# Altium integrated library Lattice CPLD ispLSI.IntLib: 471 symbols (part 14 of 26) (continued)
## ispLSI3160-70LQ (continued)
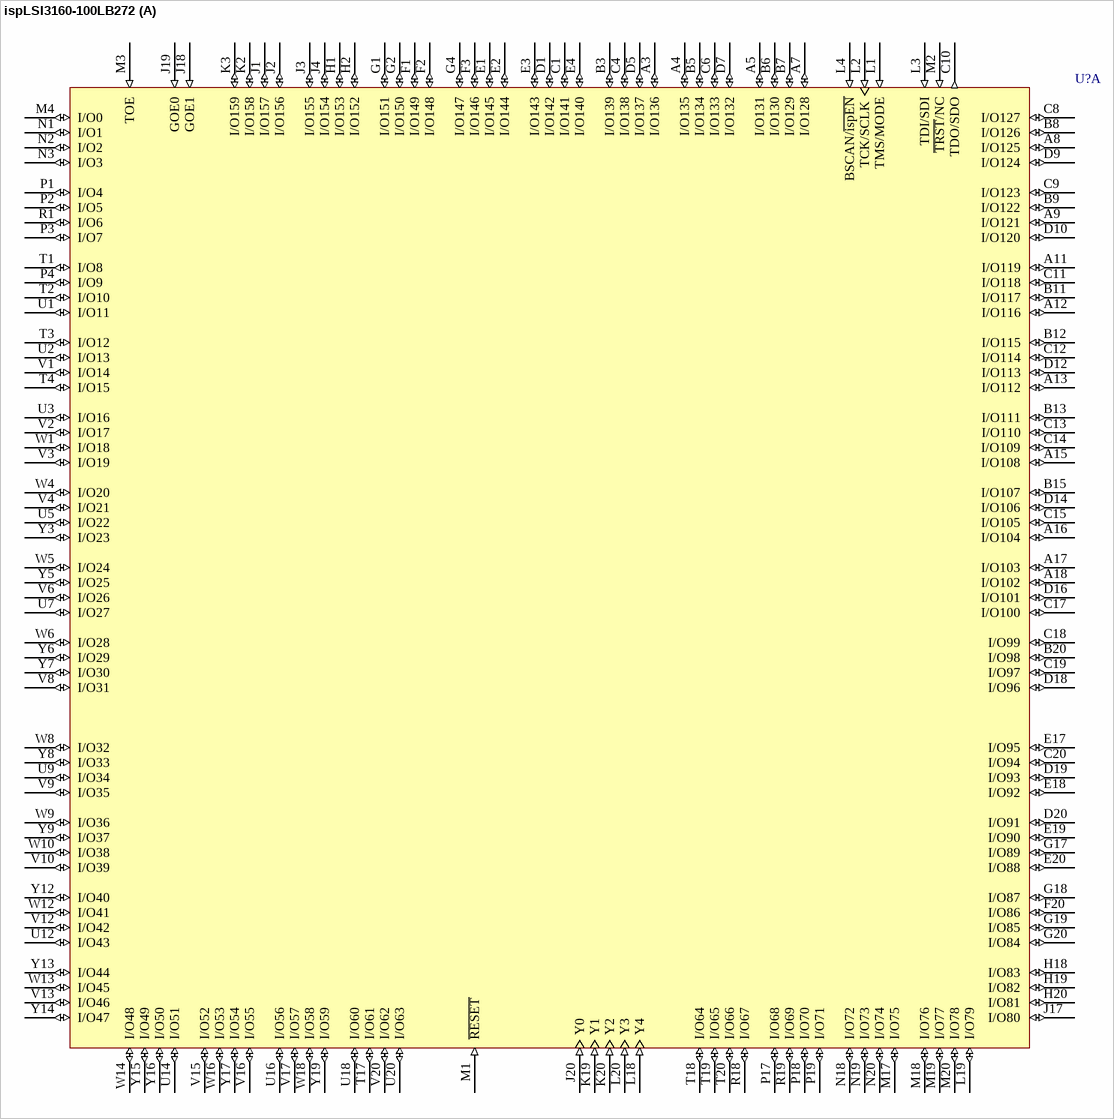
[diagram p117: symbol ispLSI3160-100LB272]

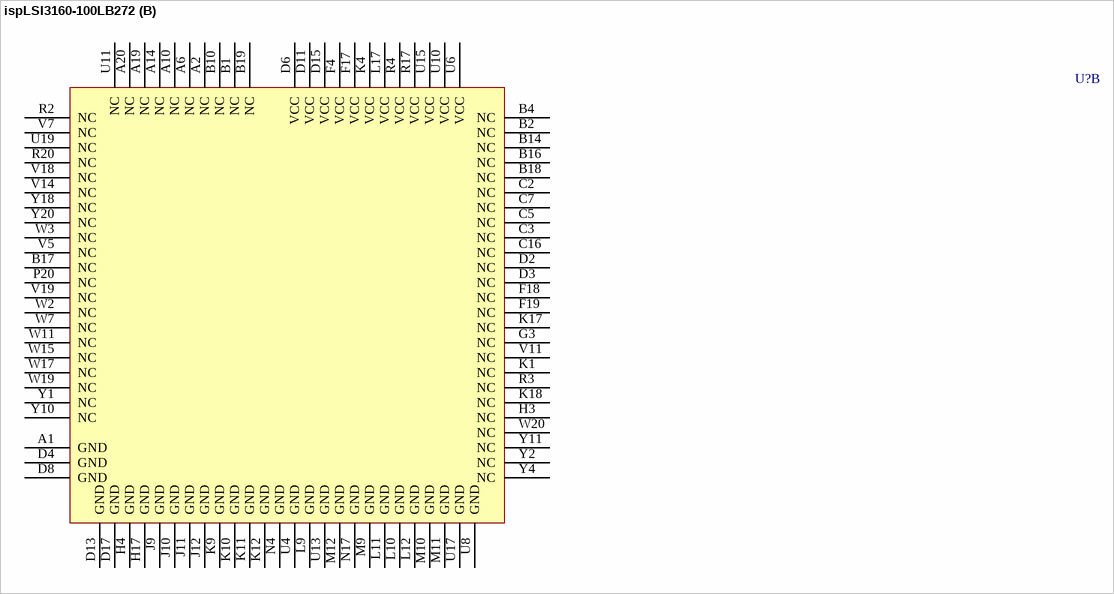
[diagram p118: symbol ispLSI3160-100LB272]

## ispLSI3160-100LB272
designator U?
In-System Programmable High-Density PLD; Published: 23-Sep-2002; LatestRevisionDate: 13-Apr-2006; LatestRevisionNote: IPC-7351 Footprint Added.; DatasheetVersion: May-1999; PackageVersion: pkg_32, Aug-2005; PackageReference: BGA272; Publisher: Altium Limited; PackageDescription: 272-Ball Ball Grid Array (BGA272); ComponentLink1Description: Manufacturer Link; ComponentLink1URL: http://www.latticesemi.com/products/mature/index.cfm; ComponentLink2Description: Datasheet; ComponentLink2URL: http://www.latticesemi.com/lit/docs/datasheets/cpld/3160.pdf
footprint BGA272 (BGA, 272-Leads, Body 27x27mm, Pitch 1.27mm)
3D model 3160-BGA272 (272-Ball Ball Grid Array (BGA272))
part A pins: A3 I/O136 (io), A4 I/O135 (io), A5 I/O131 (io), A7 I/O128 (io), A8 I/O125 (io), A9 I/O121 (io), A11 I/O119 (io), A12 I/O116 (io), A13 I/O112 (io), A15 I/O108 (io), A16 I/O104 (io), A17 I/O103 (io), A18 I/O102 (io), B3 I/O139 (io), B5 I/O134 (io), B6 I/O130 (io), B7 I/O129 (io), B8 I/O126 (io), B9 I/O122 (io), B11 I/O117 (io), B12 I/O115 (io), B13 I/O111 (io), B15 I/O107 (io), B20 I/O98 (io), C1 I/O141 (io), C4 I/O138 (io), C6 I/O133 (io), C8 I/O127 (io), C9 I/O123 (io), C10 TDO/SDO (out), C11 I/O118 (io), C12 I/O114 (io), C13 I/O110 (io), C14 I/O109 (io), C15 I/O105 (io), C17 I/O100 (io), C18 I/O99 (io), C19 I/O97 (io), C20 I/O94 (io), D1 I/O142 (io), D5 I/O137 (io), D7 I/O132 (io), D9 I/O124 (io), D10 I/O120 (io), D12 I/O113 (io), D14 I/O106 (io), D16 I/O101 (io), D18 I/O96 (io), D19 I/O93 (io), D20 I/O91 (io), E1 I/O145 (io), E2 I/O144 (io), E3 I/O143 (io), E4 I/O140 (io), E17 I/O95 (io), E18 I/O92 (io), E19 I/O90 (io), E20 I/O88 (io), F1 I/O149 (io), F2 I/O148 (io), F3 I/O146 (io), F20 I/O86 (io), G1 I/O151 (io), G2 I/O150 (io), G4 I/O147 (io), G17 I/O89 (io), G18 I/O87 (io), G19 I/O85 (io), G20 I/O84 (io), H1 I/O153 (io), H2 I/O152 (io), H18 I/O83 (io), H19 I/O82 (io), H20 I/O81 (io), J1 I/O157 (io), J2 I/O156 (io), J3 I/O155 (io), J4 I/O154 (io), J17 I/O80 (io), J18 GOE1 (in), J19 GOE0 (in), J20 Y0 (in), K2 I/O158 (io), K3 I/O159 (io), K19 Y1 (in), K20 Y2 (in), L1 TMS/MODE (in), L2 TCK/SCLK (in), L3 TDI/SDI (in), L4 BSCAN/~{ispEN} (in), L18 Y4 (in), L19 I/O79 (io), L20 Y3 (in), M1 ~{RESET} (in), M2 ~{TRST}/NC (in), M3 TOE (in), M4 I/O0 (io), M17 I/O75 (io), M18 I/O76 (io), M19 I/O77 (io), M20 I/O78 (io), N1 I/O1 (io), N2 I/O2 (io), N3 I/O3 (io), N18 I/O72 (io), N19 I/O73 (io), N20 I/O74 (io), P1 I/O4 (io), P2 I/O5 (io), P3 I/O7 (io), P4 I/O9 (io), P17 I/O68 (io), P18 I/O70 (io), P19 I/O71 (io), R1 I/O6 (io), R18 I/O67 (io), R19 I/O69 (io), T1 I/O8 (io), T2 I/O10 (io), T3 I/O12 (io), T4 I/O15 (io), T17 I/O61 (io), T18 I/O64 (io), T19 I/O65 (io), T20 I/O66 (io), U1 I/O11 (io), U2 I/O13 (io), U3 I/O16 (io), U5 I/O22 (io), U7 I/O27 (io), U9 I/O34 (io), U12 I/O43 (io), U14 I/O51 (io), U16 I/O56 (io), U18 I/O60 (io), U20 I/O63 (io), V1 I/O14 (io), V2 I/O17 (io), V3 I/O19 (io), V4 I/O21 (io), V6 I/O26 (io), V8 I/O31 (io), V9 I/O35 (io), V10 I/O39 (io), V12 I/O42 (io), V13 I/O46 (io), V15 I/O52 (io), V16 I/O55 (io), V17 I/O57 (io), V20 I/O62 (io), W1 I/O18 (io), W4 I/O20 (io), W5 I/O24 (io), W6 I/O28 (io), W8 I/O32 (io), W9 I/O36 (io), W10 I/O38 (io), W12 I/O41 (io), W13 I/O45 (io), W14 I/O48 (io), W16 I/O53 (io), W18 I/O58 (io), Y3 I/O23 (io), Y5 I/O25 (io), Y6 I/O29 (io), Y7 I/O30 (io), Y8 I/O33 (io), Y9 I/O37 (io), Y12 I/O40 (io), Y13 I/O44 (io), Y14 I/O47 (io), Y15 I/O49 (io), Y16 I/O50 (io), Y17 I/O54 (io), Y19 I/O59 (io)
part B pins: A1 GND (power), A2 NC, A6 NC, A10 NC, A14 NC, A19 NC, A20 NC, B1 NC, B2 NC, B4 NC, B10 NC, B14 NC, B16 NC, B17 NC, B18 NC, B19 NC, C2 NC, C3 NC, C5 NC, C7 NC, C16 NC, D2 NC, D3 NC, D4 GND (power), D6 VCC (power), D8 GND (power), D11 VCC (power), D13 GND (power), D15 VCC (power), D17 GND (power), F4 VCC (power), F17 VCC (power), F18 NC, F19 NC, G3 NC, H3 NC, H4 GND (power), H17 GND (power), J9 GND (power), J10 GND (power), J11 GND (power), J12 GND (power), K1 NC, K4 VCC (power), K9 GND (power), K10 GND (power), K11 GND (power), K12 GND (power), K17 NC, K18 NC, L9 GND (power), L10 GND (power), L11 GND (power), L12 GND (power), L17 VCC (power), M9 GND (power), M10 GND (power), M11 GND (power), M12 GND (power), N4 GND (power), N17 GND (power), P20 NC, R2 NC, R3 NC, R4 VCC (power), R17 VCC (power), R20 NC, U4 GND (power), U6 VCC (power), U8 GND (power), U10 VCC (power), U11 NC, U13 GND (power), U15 VCC (power), U17 GND (power), U19 NC, V5 NC, V7 NC, V11 NC, V14 NC, V18 NC, V19 NC, W2 NC, W3 NC, W7 NC, W11 NC, W15 NC, W17 NC, W19 NC, W20 NC, Y1 NC, Y2 NC, Y4 NC, Y10 NC, Y11 NC, Y18 NC, Y20 NC

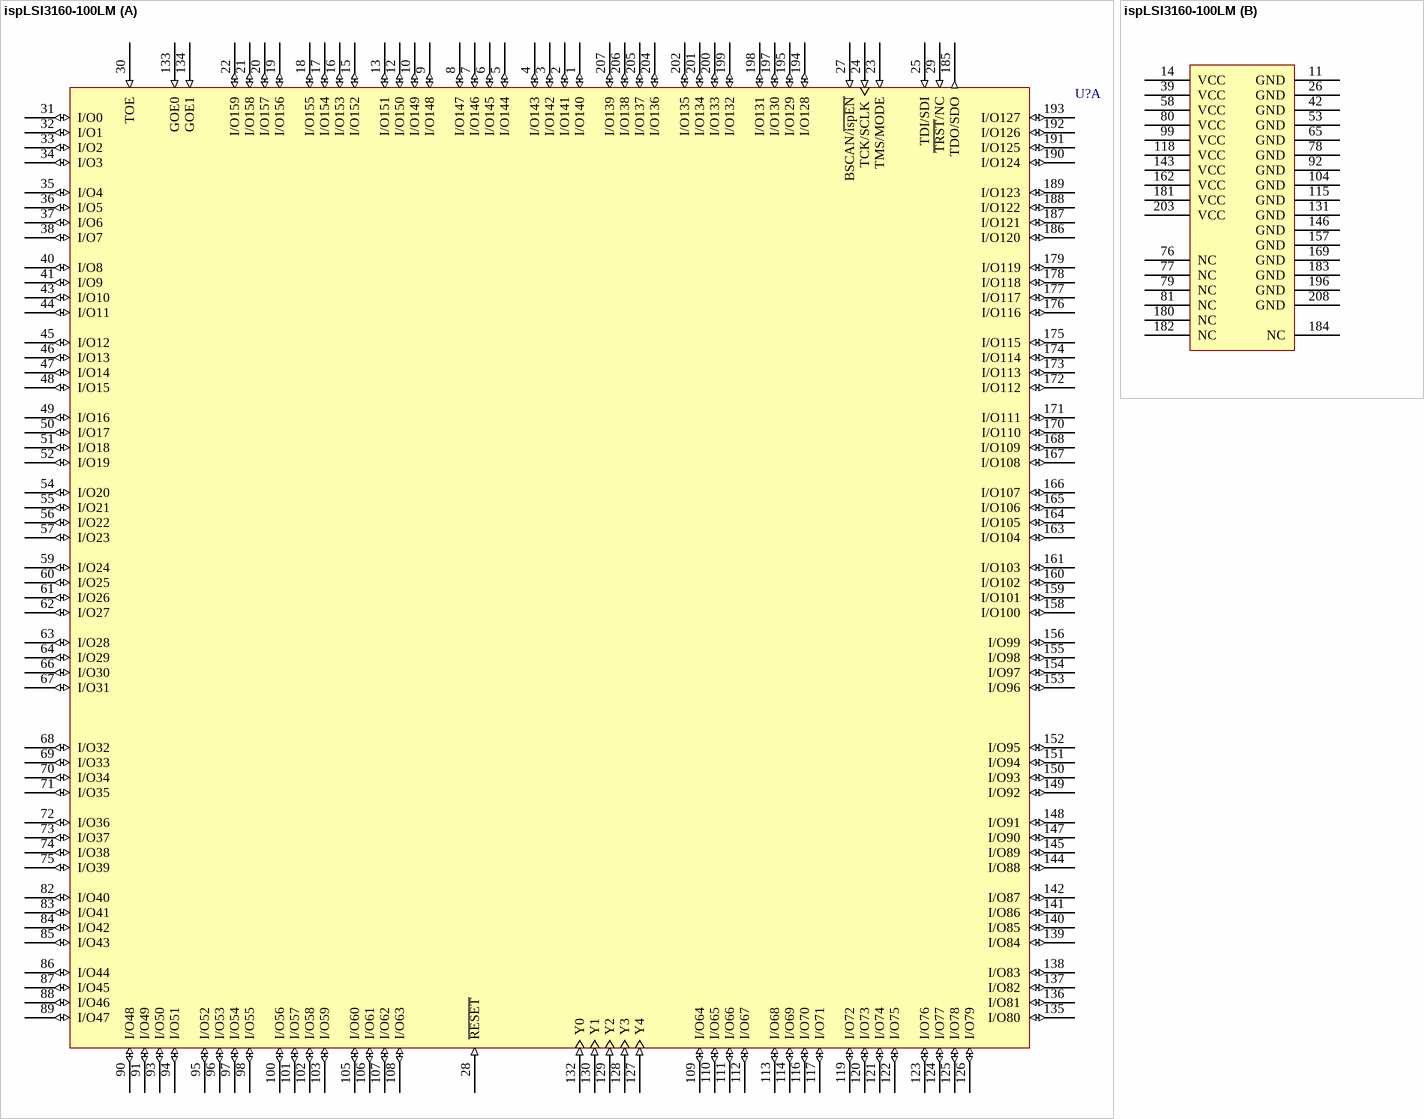
[diagram p119: symbol ispLSI3160-100LM]

## ispLSI3160-100LM
designator U?
In-System Programmable High-Density PLD; Published: 23-Sep-2002; LatestRevisionDate: 13-Apr-2006; LatestRevisionNote: IPC-7351 Footprint Added.; DatasheetVersion: May-1999; PackageVersion: Sep-2000; PackageReference: MQFP208; Publisher: Altium Limited; PackageDescription: 208-Pin Shrink Quad Flat Pack 0.5 mm Pitch; ComponentLink1Description: Manufacturer Link; ComponentLink1URL: http://www.latticesemi.com/products/mature/index.cfm; ComponentLink2Description: Datasheet; ComponentLink2URL: http://www.latticesemi.com/lit/docs/datasheets/cpld/3160.pdf
footprint MQFP208_N (Shrink QFP, 208-Leads, Body 27.7x27.7mm, Pitch 0.5mm, IPC Medium Density)
footprint MQFP208_L (Shrink QFP, 208-Leads, Body 27.7x27.7mm, Pitch 0.5mm, IPC High Density)
footprint MQFP208_M (Shrink QFP, 208-Leads, Body 27.7x27.7mm, Pitch 0.5mm, IPC Low Density)
3D model 3160-MQFP208 (208-Pin Shrink Quad Flat Pack 0.5 mm Pitch)
part A pins: 1 I/O140 (io), 2 I/O141 (io), 3 I/O142 (io), 4 I/O143 (io), 5 I/O144 (io), 6 I/O145 (io), 7 I/O146 (io), 8 I/O147 (io), 9 I/O148 (io), 10 I/O149 (io), 12 I/O150 (io), 13 I/O151 (io), 15 I/O152 (io), 16 I/O153 (io), 17 I/O154 (io), 18 I/O155 (io), 19 I/O156 (io), 20 I/O157 (io), 21 I/O158 (io), 22 I/O159 (io), 23 TMS/MODE (in), 24 TCK/SCLK (in), 25 TDI/SDI (in), 27 BSCAN/~{ispEN} (in), 28 ~{RESET} (in), 29 ~{TRST}/NC (in), 30 TOE (in), 31 I/O0 (io), 32 I/O1 (io), 33 I/O2 (io), 34 I/O3 (io), 35 I/O4 (io), 36 I/O5 (io), 37 I/O6 (io), 38 I/O7 (io), 40 I/O8 (io), 41 I/O9 (io), 43 I/O10 (io), 44 I/O11 (io), 45 I/O12 (io), 46 I/O13 (io), 47 I/O14 (io), 48 I/O15 (io), 49 I/O16 (io), 50 I/O17 (io), 51 I/O18 (io), 52 I/O19 (io), 54 I/O20 (io), 55 I/O21 (io), 56 I/O22 (io), 57 I/O23 (io), 59 I/O24 (io), 60 I/O25 (io), 61 I/O26 (io), 62 I/O27 (io), 63 I/O28 (io), 64 I/O29 (io), 66 I/O30 (io), 67 I/O31 (io), 68 I/O32 (io), 69 I/O33 (io), 70 I/O34 (io), 71 I/O35 (io), 72 I/O36 (io), 73 I/O37 (io), 74 I/O38 (io), 75 I/O39 (io), 82 I/O40 (io), 83 I/O41 (io), 84 I/O42 (io), 85 I/O43 (io), 86 I/O44 (io), 87 I/O45 (io), 88 I/O46 (io), 89 I/O47 (io), 90 I/O48 (io), 91 I/O49 (io), 93 I/O50 (io), 94 I/O51 (io), 95 I/O52 (io), 96 I/O53 (io), 97 I/O54 (io), 98 I/O55 (io), 100 I/O56 (io), 101 I/O57 (io), 102 I/O58 (io), 103 I/O59 (io), 105 I/O60 (io), 106 I/O61 (io), 107 I/O62 (io), 108 I/O63 (io), 109 I/O64 (io), 110 I/O65 (io), 111 I/O66 (io), 112 I/O67 (io), 113 I/O68 (io), 114 I/O69 (io), 116 I/O70 (io), 117 I/O71 (io), 119 I/O72 (io), 120 I/O73 (io), 121 I/O74 (io), 122 I/O75 (io), 123 I/O76 (io), 124 I/O77 (io), 125 I/O78 (io), 126 I/O79 (io), 127 Y4 (in), 128 Y3 (in), 129 Y2 (in), 130 Y1 (in), 132 Y0 (in), 133 GOE0 (in), 134 GOE1 (in), 135 I/O80 (io), 136 I/O81 (io), 137 I/O82 (io), 138 I/O83 (io), 139 I/O84 (io), 140 I/O85 (io), 141 I/O86 (io), 142 I/O87 (io), 144 I/O88 (io), 145 I/O89 (io), 147 I/O90 (io), 148 I/O91 (io), 149 I/O92 (io), 150 I/O93 (io), 151 I/O94 (io), 152 I/O95 (io), 153 I/O96 (io), 154 I/O97 (io), 155 I/O98 (io), 156 I/O99 (io), 158 I/O100 (io), 159 I/O101 (io), 160 I/O102 (io), 161 I/O103 (io), 163 I/O104 (io), 164 I/O105 (io), 165 I/O106 (io), 166 I/O107 (io), 167 I/O108 (io), 168 I/O109 (io), 170 I/O110 (io), 171 I/O111 (io), 172 I/O112 (io), 173 I/O113 (io), 174 I/O114 (io), 175 I/O115 (io), 176 I/O116 (io), 177 I/O117 (io), 178 I/O118 (io), 179 I/O119 (io), 185 TDO/SDO (out), 186 I/O120 (io), 187 I/O121 (io), 188 I/O122 (io), 189 I/O123 (io), 190 I/O124 (io), 191 I/O125 (io), 192 I/O126 (io), 193 I/O127 (io), 194 I/O128 (io), 195 I/O129 (io), 197 I/O130 (io), 198 I/O131 (io), 199 I/O132 (io), 200 I/O133 (io), 201 I/O134 (io), 202 I/O135 (io), 204 I/O136 (io), 205 I/O137 (io), 206 I/O138 (io), 207 I/O139 (io)
part B pins: 11 GND (power), 14 VCC (power), 26 GND (power), 39 VCC (power), 42 GND (power), 53 GND (power), 58 VCC (power), 65 GND (power), 76 NC, 77 NC, 78 GND (power), 79 NC, 80 VCC (power), 81 NC, 92 GND (power), 99 VCC (power), 104 GND (power), 115 GND (power), 118 VCC (power), 131 GND (power), 143 VCC (power), 146 GND (power), 157 GND (power), 162 VCC (power), 169 GND (power), 180 NC, 181 VCC (power), 182 NC, 183 GND (power), 184 NC, 196 GND (power), 203 VCC (power), 208 GND (power)

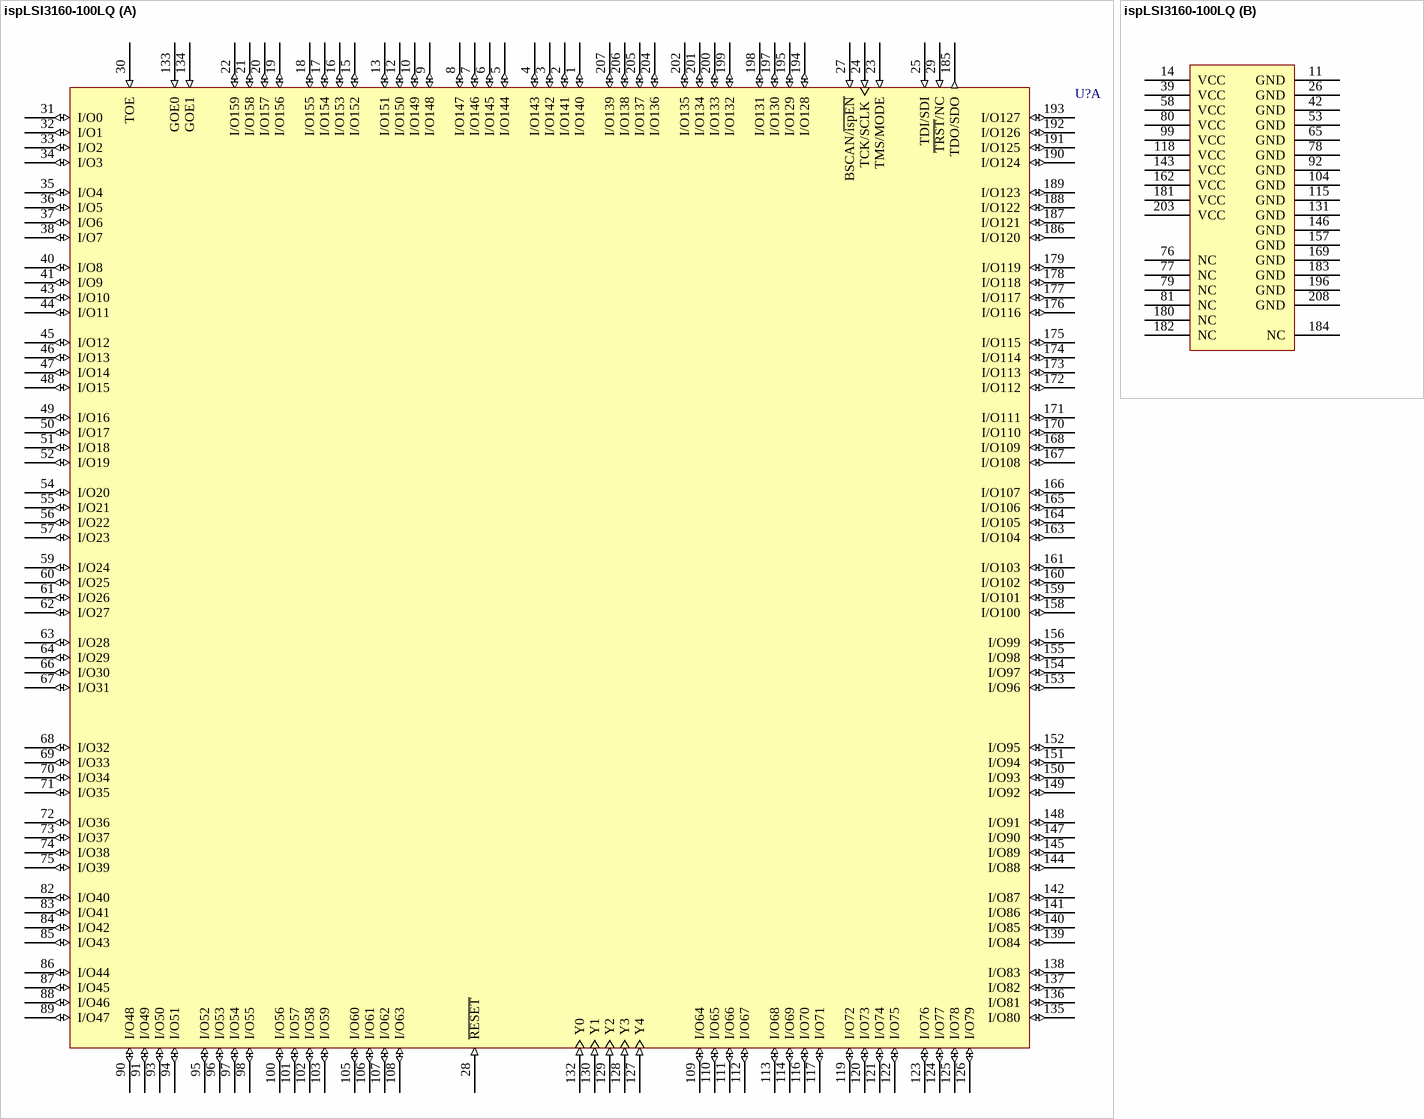
[diagram p120: symbol ispLSI3160-100LQ]

## ispLSI3160-100LQ
designator U?
In-System Programmable High-Density PLD; Published: 23-Sep-2002; LatestRevisionDate: 13-Apr-2006; LatestRevisionNote: IPC-7351 Footprint Added.; DatasheetVersion: May-1999; PackageVersion: pkg_32, Aug-2005; PackageReference: PQFP208; Publisher: Altium Limited; PackageDescription: 208-Pin Plastic Quad Flat Pack (PQFP208); Code_JEDEC: MO-143-FAI; ComponentLink1Description: Manufacturer Link; ComponentLink1URL: http://www.latticesemi.com/products/mature/index.cfm; ComponentLink2Description: Datasheet; ComponentLink2URL: http://www.latticesemi.com/lit/docs/datasheets/cpld/3160.pdf
footprint PQFP208_N (Shrink QFP, 208-Leads, Body 28x28mm, Pitch 0.5mm, IPC Medium Density)
footprint PQFP208_L (Shrink QFP, 208-Leads, Body 28x28mm, Pitch 0.5mm, IPC High Density)
footprint PQFP208_M (Shrink QFP, 208-Leads, Body 28x28mm, Pitch 0.5mm, IPC Low Density)
3D model 3160-PQFP208 (208-Pin Plastic Quad Flat Pack (PQFP208))
part A pins: 1 I/O140 (io), 2 I/O141 (io), 3 I/O142 (io), 4 I/O143 (io), 5 I/O144 (io), 6 I/O145 (io), 7 I/O146 (io), 8 I/O147 (io), 9 I/O148 (io), 10 I/O149 (io), 12 I/O150 (io), 13 I/O151 (io), 15 I/O152 (io), 16 I/O153 (io), 17 I/O154 (io), 18 I/O155 (io), 19 I/O156 (io), 20 I/O157 (io), 21 I/O158 (io), 22 I/O159 (io), 23 TMS/MODE (in), 24 TCK/SCLK (in), 25 TDI/SDI (in), 27 BSCAN/~{ispEN} (in), 28 ~{RESET} (in), 29 ~{TRST}/NC (in), 30 TOE (in), 31 I/O0 (io), 32 I/O1 (io), 33 I/O2 (io), 34 I/O3 (io), 35 I/O4 (io), 36 I/O5 (io), 37 I/O6 (io), 38 I/O7 (io), 40 I/O8 (io), 41 I/O9 (io), 43 I/O10 (io), 44 I/O11 (io), 45 I/O12 (io), 46 I/O13 (io), 47 I/O14 (io), 48 I/O15 (io), 49 I/O16 (io), 50 I/O17 (io), 51 I/O18 (io), 52 I/O19 (io), 54 I/O20 (io), 55 I/O21 (io), 56 I/O22 (io), 57 I/O23 (io), 59 I/O24 (io), 60 I/O25 (io), 61 I/O26 (io), 62 I/O27 (io), 63 I/O28 (io), 64 I/O29 (io), 66 I/O30 (io), 67 I/O31 (io), 68 I/O32 (io), 69 I/O33 (io), 70 I/O34 (io), 71 I/O35 (io), 72 I/O36 (io), 73 I/O37 (io), 74 I/O38 (io), 75 I/O39 (io), 82 I/O40 (io), 83 I/O41 (io), 84 I/O42 (io), 85 I/O43 (io), 86 I/O44 (io), 87 I/O45 (io), 88 I/O46 (io), 89 I/O47 (io), 90 I/O48 (io), 91 I/O49 (io), 93 I/O50 (io), 94 I/O51 (io), 95 I/O52 (io), 96 I/O53 (io), 97 I/O54 (io), 98 I/O55 (io), 100 I/O56 (io), 101 I/O57 (io), 102 I/O58 (io), 103 I/O59 (io), 105 I/O60 (io), 106 I/O61 (io), 107 I/O62 (io), 108 I/O63 (io), 109 I/O64 (io), 110 I/O65 (io), 111 I/O66 (io), 112 I/O67 (io), 113 I/O68 (io), 114 I/O69 (io), 116 I/O70 (io), 117 I/O71 (io), 119 I/O72 (io), 120 I/O73 (io), 121 I/O74 (io), 122 I/O75 (io), 123 I/O76 (io), 124 I/O77 (io), 125 I/O78 (io), 126 I/O79 (io), 127 Y4 (in), 128 Y3 (in), 129 Y2 (in), 130 Y1 (in), 132 Y0 (in), 133 GOE0 (in), 134 GOE1 (in), 135 I/O80 (io), 136 I/O81 (io), 137 I/O82 (io), 138 I/O83 (io), 139 I/O84 (io), 140 I/O85 (io), 141 I/O86 (io), 142 I/O87 (io), 144 I/O88 (io), 145 I/O89 (io), 147 I/O90 (io), 148 I/O91 (io), 149 I/O92 (io), 150 I/O93 (io), 151 I/O94 (io), 152 I/O95 (io), 153 I/O96 (io), 154 I/O97 (io), 155 I/O98 (io), 156 I/O99 (io), 158 I/O100 (io), 159 I/O101 (io), 160 I/O102 (io), 161 I/O103 (io), 163 I/O104 (io), 164 I/O105 (io), 165 I/O106 (io), 166 I/O107 (io), 167 I/O108 (io), 168 I/O109 (io), 170 I/O110 (io), 171 I/O111 (io), 172 I/O112 (io), 173 I/O113 (io), 174 I/O114 (io), 175 I/O115 (io), 176 I/O116 (io), 177 I/O117 (io), 178 I/O118 (io), 179 I/O119 (io), 185 TDO/SDO (out), 186 I/O120 (io), 187 I/O121 (io), 188 I/O122 (io), 189 I/O123 (io), 190 I/O124 (io), 191 I/O125 (io), 192 I/O126 (io), 193 I/O127 (io), 194 I/O128 (io), 195 I/O129 (io), 197 I/O130 (io), 198 I/O131 (io), 199 I/O132 (io), 200 I/O133 (io), 201 I/O134 (io), 202 I/O135 (io), 204 I/O136 (io), 205 I/O137 (io), 206 I/O138 (io), 207 I/O139 (io)
part B pins: 11 GND (power), 14 VCC (power), 26 GND (power), 39 VCC (power), 42 GND (power), 53 GND (power), 58 VCC (power), 65 GND (power), 76 NC, 77 NC, 78 GND (power), 79 NC, 80 VCC (power), 81 NC, 92 GND (power), 99 VCC (power), 104 GND (power), 115 GND (power), 118 VCC (power), 131 GND (power), 143 VCC (power), 146 GND (power), 157 GND (power), 162 VCC (power), 169 GND (power), 180 NC, 181 VCC (power), 182 NC, 183 GND (power), 184 NC, 196 GND (power), 203 VCC (power), 208 GND (power)

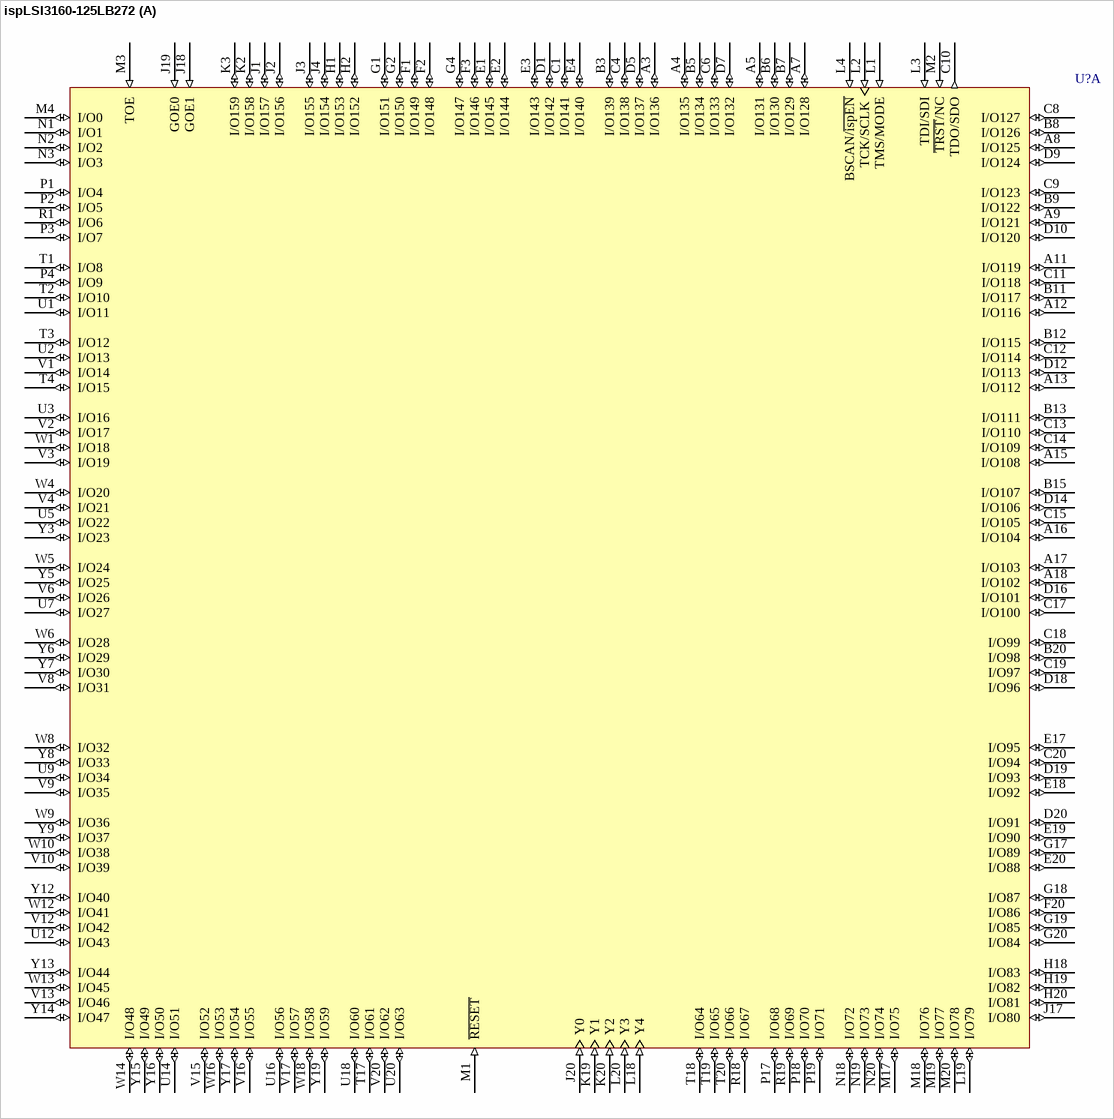
[diagram p121: symbol ispLSI3160-125LB272]

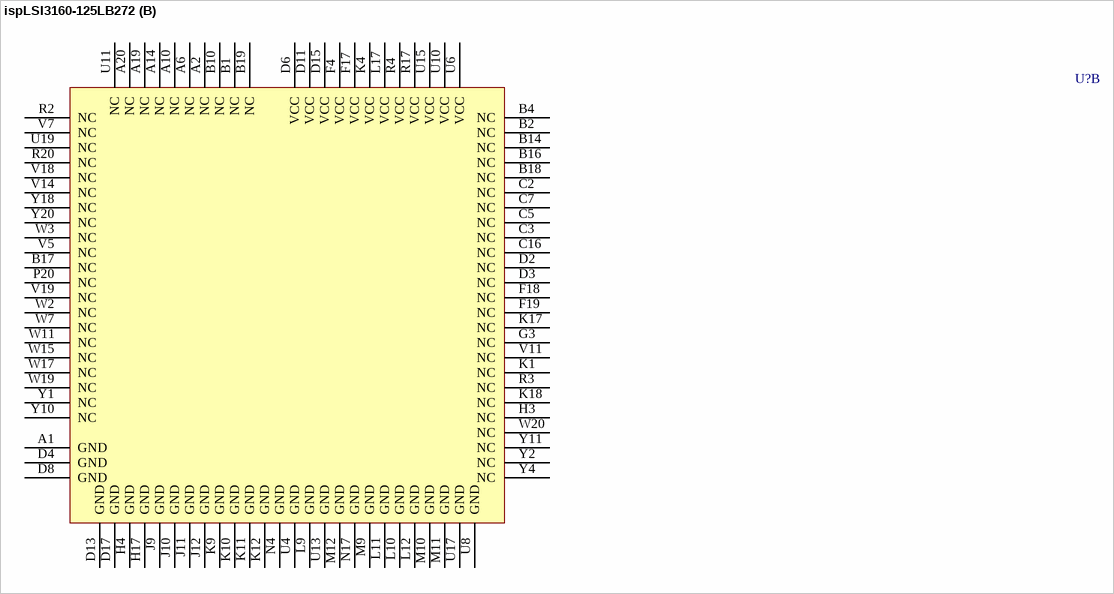
[diagram p122: symbol ispLSI3160-125LB272]

## ispLSI3160-125LB272
designator U?
In-System Programmable High-Density PLD; Published: 23-Sep-2002; LatestRevisionDate: 13-Apr-2006; LatestRevisionNote: IPC-7351 Footprint Added.; DatasheetVersion: May-1999; PackageVersion: pkg_32, Aug-2005; PackageReference: BGA272; Publisher: Altium Limited; PackageDescription: 272-Ball Ball Grid Array (BGA272); ComponentLink1Description: Manufacturer Link; ComponentLink1URL: http://www.latticesemi.com/products/mature/index.cfm; ComponentLink2Description: Datasheet; ComponentLink2URL: http://www.latticesemi.com/lit/docs/datasheets/cpld/3160.pdf
footprint BGA272 (BGA, 272-Leads, Body 27x27mm, Pitch 1.27mm)
3D model 3160-BGA272 (272-Ball Ball Grid Array (BGA272))
part A pins: A3 I/O136 (io), A4 I/O135 (io), A5 I/O131 (io), A7 I/O128 (io), A8 I/O125 (io), A9 I/O121 (io), A11 I/O119 (io), A12 I/O116 (io), A13 I/O112 (io), A15 I/O108 (io), A16 I/O104 (io), A17 I/O103 (io), A18 I/O102 (io), B3 I/O139 (io), B5 I/O134 (io), B6 I/O130 (io), B7 I/O129 (io), B8 I/O126 (io), B9 I/O122 (io), B11 I/O117 (io), B12 I/O115 (io), B13 I/O111 (io), B15 I/O107 (io), B20 I/O98 (io), C1 I/O141 (io), C4 I/O138 (io), C6 I/O133 (io), C8 I/O127 (io), C9 I/O123 (io), C10 TDO/SDO (out), C11 I/O118 (io), C12 I/O114 (io), C13 I/O110 (io), C14 I/O109 (io), C15 I/O105 (io), C17 I/O100 (io), C18 I/O99 (io), C19 I/O97 (io), C20 I/O94 (io), D1 I/O142 (io), D5 I/O137 (io), D7 I/O132 (io), D9 I/O124 (io), D10 I/O120 (io), D12 I/O113 (io), D14 I/O106 (io), D16 I/O101 (io), D18 I/O96 (io), D19 I/O93 (io), D20 I/O91 (io), E1 I/O145 (io), E2 I/O144 (io), E3 I/O143 (io), E4 I/O140 (io), E17 I/O95 (io), E18 I/O92 (io), E19 I/O90 (io), E20 I/O88 (io), F1 I/O149 (io), F2 I/O148 (io), F3 I/O146 (io), F20 I/O86 (io), G1 I/O151 (io), G2 I/O150 (io), G4 I/O147 (io), G17 I/O89 (io), G18 I/O87 (io), G19 I/O85 (io), G20 I/O84 (io), H1 I/O153 (io), H2 I/O152 (io), H18 I/O83 (io), H19 I/O82 (io), H20 I/O81 (io), J1 I/O157 (io), J2 I/O156 (io), J3 I/O155 (io), J4 I/O154 (io), J17 I/O80 (io), J18 GOE1 (in), J19 GOE0 (in), J20 Y0 (in), K2 I/O158 (io), K3 I/O159 (io), K19 Y1 (in), K20 Y2 (in), L1 TMS/MODE (in), L2 TCK/SCLK (in), L3 TDI/SDI (in), L4 BSCAN/~{ispEN} (in), L18 Y4 (in), L19 I/O79 (io), L20 Y3 (in), M1 ~{RESET} (in), M2 ~{TRST}/NC (in), M3 TOE (in), M4 I/O0 (io), M17 I/O75 (io), M18 I/O76 (io), M19 I/O77 (io), M20 I/O78 (io), N1 I/O1 (io), N2 I/O2 (io), N3 I/O3 (io), N18 I/O72 (io), N19 I/O73 (io), N20 I/O74 (io), P1 I/O4 (io), P2 I/O5 (io), P3 I/O7 (io), P4 I/O9 (io), P17 I/O68 (io), P18 I/O70 (io), P19 I/O71 (io), R1 I/O6 (io), R18 I/O67 (io), R19 I/O69 (io), T1 I/O8 (io), T2 I/O10 (io), T3 I/O12 (io), T4 I/O15 (io), T17 I/O61 (io), T18 I/O64 (io), T19 I/O65 (io), T20 I/O66 (io), U1 I/O11 (io), U2 I/O13 (io), U3 I/O16 (io), U5 I/O22 (io), U7 I/O27 (io), U9 I/O34 (io), U12 I/O43 (io), U14 I/O51 (io), U16 I/O56 (io), U18 I/O60 (io), U20 I/O63 (io), V1 I/O14 (io), V2 I/O17 (io), V3 I/O19 (io), V4 I/O21 (io), V6 I/O26 (io), V8 I/O31 (io), V9 I/O35 (io), V10 I/O39 (io), V12 I/O42 (io), V13 I/O46 (io), V15 I/O52 (io), V16 I/O55 (io), V17 I/O57 (io), V20 I/O62 (io), W1 I/O18 (io), W4 I/O20 (io), W5 I/O24 (io), W6 I/O28 (io), W8 I/O32 (io), W9 I/O36 (io), W10 I/O38 (io), W12 I/O41 (io), W13 I/O45 (io), W14 I/O48 (io), W16 I/O53 (io), W18 I/O58 (io), Y3 I/O23 (io), Y5 I/O25 (io), Y6 I/O29 (io), Y7 I/O30 (io), Y8 I/O33 (io), Y9 I/O37 (io), Y12 I/O40 (io), Y13 I/O44 (io), Y14 I/O47 (io), Y15 I/O49 (io), Y16 I/O50 (io), Y17 I/O54 (io), Y19 I/O59 (io)
part B pins: A1 GND (power), A2 NC, A6 NC, A10 NC, A14 NC, A19 NC, A20 NC, B1 NC, B2 NC, B4 NC, B10 NC, B14 NC, B16 NC, B17 NC, B18 NC, B19 NC, C2 NC, C3 NC, C5 NC, C7 NC, C16 NC, D2 NC, D3 NC, D4 GND (power), D6 VCC (power), D8 GND (power), D11 VCC (power), D13 GND (power), D15 VCC (power), D17 GND (power), F4 VCC (power), F17 VCC (power), F18 NC, F19 NC, G3 NC, H3 NC, H4 GND (power), H17 GND (power), J9 GND (power), J10 GND (power), J11 GND (power), J12 GND (power), K1 NC, K4 VCC (power), K9 GND (power), K10 GND (power), K11 GND (power), K12 GND (power), K17 NC, K18 NC, L9 GND (power), L10 GND (power), L11 GND (power), L12 GND (power), L17 VCC (power), M9 GND (power), M10 GND (power), M11 GND (power), M12 GND (power), N4 GND (power), N17 GND (power), P20 NC, R2 NC, R3 NC, R4 VCC (power), R17 VCC (power), R20 NC, U4 GND (power), U6 VCC (power), U8 GND (power), U10 VCC (power), U11 NC, U13 GND (power), U15 VCC (power), U17 GND (power), U19 NC, V5 NC, V7 NC, V11 NC, V14 NC, V18 NC, V19 NC, W2 NC, W3 NC, W7 NC, W11 NC, W15 NC, W17 NC, W19 NC, W20 NC, Y1 NC, Y2 NC, Y4 NC, Y10 NC, Y11 NC, Y18 NC, Y20 NC
